# Altium footprint library DIP Component.PcbLib: 327 footprints (part 3 of 21)
Each footprint in its own frame and in the unit in brackets; x right, y up, seen from the top. Pads: shape width x height; smd on the part's side, far side on the other; paste and mask are expansions set on the pad; w line width, h text height; cw(c..) or ccw(c..) is an arc to the next point about the centre after c.
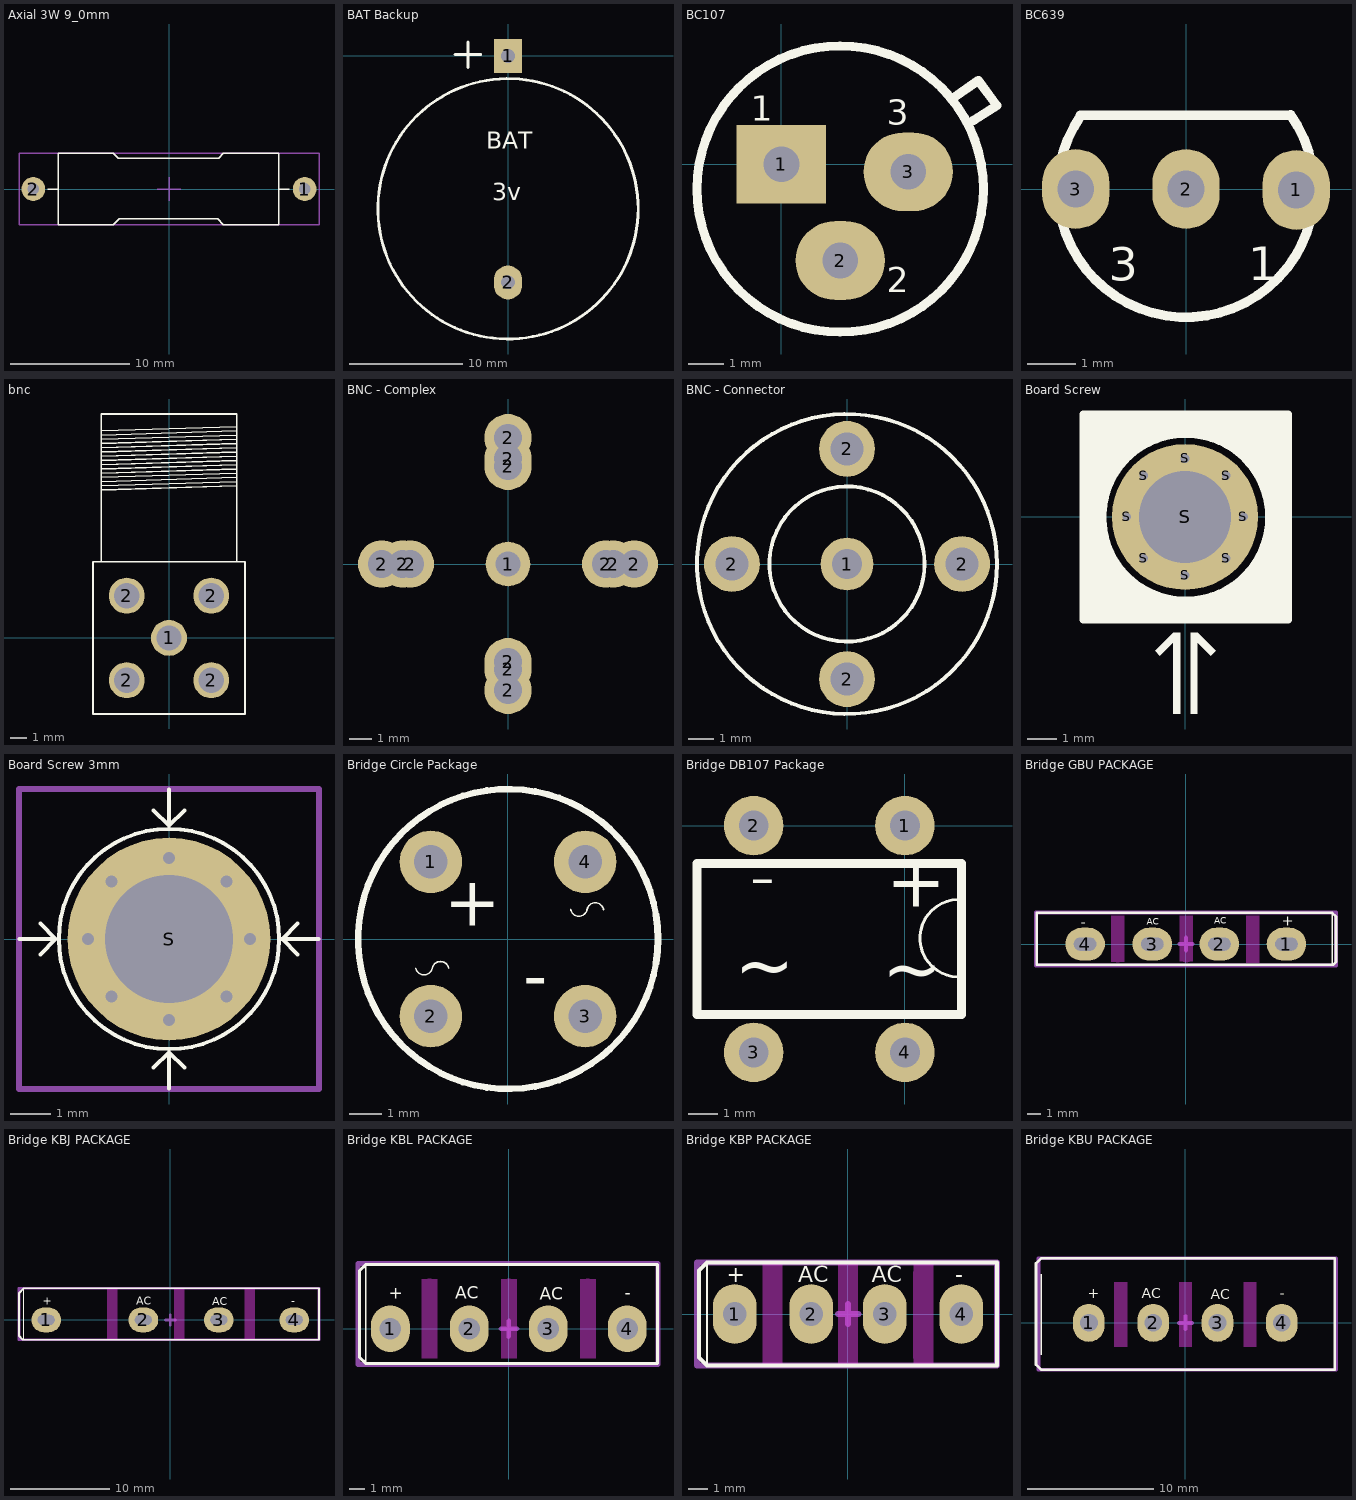
[diagram p2: the footprints below, top view; thin cyan lines are the x and y axes]

## Axial 3W 9_0mm [mm] "Designer Abbas Basereh"
height 9
pads (2):
  round 2 hole 1: 1(11.4,0) 2(-11.4,0)
Top Overlay:
  lines w0.12: -10.2,0 -9.3,0 ; 9.2,0 10.1,0 ; -9.3,-3 -4.675,-3 -4.175,-2.5 4.075,-2.5 4.575,-3 9.2,-3 9.2,3 4.575,3 4.175,2.6 -4.275,2.6 -4.675,3 -9.3,3 -9.3,-3
Mechanical 15:
  lines w0.12: -1,0 1,0 ; 0,-1 0,1 ; -12.6,-3 -12.6,3 12.6,3 12.6,-3 -12.6,-3
3D body "User Library-Res90 3W SilCoat.STEP": height 6.73, standoff -1.3, extent -11.835,-3.01 11.835,3.01

## BAT Backup [mm]
pads (2):
  rect 2.5x3 hole 1.2: 1(0,0)
  oval 2.5x3 hole 1.2: 2(0,-20)
Top Overlay:
  circle w0.254: c0,-13.5 r11.5
  lines w0.254: -4.67,0.14 -2.41,0.14 ; -3.52,-1.01 -3.52,1.25
  text "3v" at -1.405,-12.75 h1.52
  text "BAT" at -1.905,-8.18 h1.52
3D body "User Library-20mm_coin_holder.STEP": height 9.17, standoff -3, extent -11.5,-24.716 11.5,2.716

## BC107 [mm]
pads (3):
  rect 2.5x2.2 hole 1: 1(0,0)
  oval 2.5x2.2 hole 1: 2(1.64,-2.69) 3(3.54,-0.21)
Top Overlay:
  circle w0.254: c1.64,-0.69 r4
  lines w0.254: 4.78,1.85 5.5,2.34 6.02,1.64 5.37,1.23
  text "3" at 2.935,1.1 h0.7
  text "1" at -0.86,1.21 h0.7
  text "2" at 2.935,-3.57 h0.7

## BC639 [mil] "NPN Transistorq"
height 322.83
pads (3):
  oval 55x65 hole 30: 1(90,-0.79) 2(0,0) 3(-90,0)
Top Overlay:
  lines w7.87: -86.22,60.24 84.65,60.24 ; -85.85,59.98 ccw(c0,0) 85.32,60.72
  text "1" at 51,-74.41 h27.56
  text "3" at -62.99,-74.8 h27.56
3D body "SW3dPS-TO-92A.STEP": height 314.96, standoff -118.11, extent -90.55,-94.49 98.43,60.24

## bnc [mil]
pads (5):
  round 85 hole 60 mask+10: 1(0,0) 2(-100,-100) 2(-100,100) 2(100,-100) 2(100,100)
Top Overlay:
  lines w3.94: -160,180 -160,530 160,530 160,180 ; -160,490 160,500 160,490 -160,480 -160,470 160,480 160,470 -160,460 -160,450 160,460 160,450 -160,440 -160,430 160,440 160,430 -160,420 -160,410 160,420 160,410 -160,400 -160,390 160,400 160,390 -160,380 -160,370 160,380 160,370 -160,360 -160,350 160,360 ; -180,-180 -180,180 180,180 180,-180 -180,-180

## BNC - Complex [mil]
pads (13):
  round 80 hole 45: 1(0,0)
  round 85 hole 50: 2(-226.38,0) 2(-188.98,0) 2(-175.2,0) 2(0,-226.38) 2(0,-188.98) 2(0,-175.2) 2(0,175.2) 2(0,188.98) 2(0,226.38) 2(175.2,0) 2(188.98,0) 2(226.38,0)
3D body "BNC_complex.STEP": height 1369.68, standoff -173.23, extent -278,-278.21 278,278.2

## BNC - Connector [mil]
pads (5):
  round 80 hole 45: 1(0,0)
  round 85 hole 50: 2(-175.2,0) 2(0,-175.2) 2(0,175.2) 2(175.2,0)
Top Overlay:
  circle w5.91: c0,0 r118.11
  circle w5.91: c0,0 r228.35
3D body "My BNC Short.STEP": height 538.19, standoff -173.23, extent -218.11,-218.11 218.11,218.11

## Board Screw [mm]
pads (9):
  round 0.6 hole 0.3: S(-2,0) S(-1.414,-1.414) S(-1.414,1.414) S(0,-2) S(0,2) S(1.414,-1.414) S(1.414,1.414) S(2,0)
  round 5 hole 3.15 mask+0.1: S(0,0)
Top Overlay:
  circle w0.889: c0.025,-0.012 r3.165
  region: 0.433,-3.957 0.253,-4.137 0.882,-4.765 1.062,-4.586
  rectangle: 0.179,-6.751 0.433,-3.957
  region: -1.038,-4.586 -0.859,-4.765 -0.23,-4.137 -0.41,-3.957
  region: -0.156,-3.957 -0.41,-3.957 -0.41,-6.751 -0.156,-6.751
  region: -3.492,-3.528 -3.489,-3.531 -0.749,-3.531 -0.749,-3.482 -3.492,-0.739
  region: 3.559,-3.526 3.556,-3.528 0.816,-3.528 0.816,-3.479 3.559,-0.736
  region: 3.559,3.508 3.556,3.51 0.816,3.51 0.816,3.461 3.559,0.718
  region: -3.492,3.505 -3.489,3.508 -0.749,3.508 -0.749,3.458 -3.492,0.716
  lines w0.254: -3.494,-3.511 -3.494,3.522 3.539,3.522 ; -3.492,-3.528 3.542,-3.528 3.542,3.505
Bottom Overlay:
  circle w0.889: c0.025,-0.012 r3.165
  region: -3.492,3.505 -3.489,3.508 -0.749,3.508 -0.749,3.458 -3.492,0.716
  region: 3.559,3.508 3.556,3.51 0.816,3.51 0.816,3.461 3.559,0.718
  region: 3.559,-3.526 3.556,-3.528 0.816,-3.528 0.816,-3.479 3.559,-0.736
  region: -3.492,-3.528 -3.489,-3.531 -0.749,-3.531 -0.749,-3.482 -3.492,-0.739
  lines w0.254: -3.494,-3.511 -3.494,3.522 3.539,3.522 ; -3.492,-3.528 3.542,-3.528 3.542,3.505
3D body "User Library-User Library-4-40 x _125 sems.STEP": height 2.34, standoff -3, extent -2.667,-2.642 2.692,2.718

## Board Screw 3mm [mm]
pads (1):
  round 5 hole 3.15 mask+0.1: S(0,0)
via 0,2 diameter 0.5 hole 0.3
via 1.414,1.414 diameter 0.5 hole 0.3
via 2,0 diameter 0.5 hole 0.3
via 1.414,-1.414 diameter 0.5 hole 0.3
via 0,-2 diameter 0.5 hole 0.3
via -1.414,-1.414 diameter 0.5 hole 0.3
via -2,0 diameter 0.5 hole 0.3
via -1.414,1.414 diameter 0.5 hole 0.3
Top Overlay:
  circle w0.1: c0,0 r2.718
  lines w0.1: -3.683,0 -2.794,0 ; -3.175,-0.381 -2.794,0 ; -3.175,0.381 -2.794,0 ; -0.381,-3.175 0,-2.794 ; -0.381,3.175 0,2.794 ; 0,-3.683 0,-2.794 ; 0,3.683 0,2.794 ; 0.381,-3.175 0,-2.794 ; 0.381,3.175 0,2.794 ; 2.718,0 3.683,0 ; 3.175,-0.381 2.794,0 3.175,0.381
Mechanical 15:
  lines w0.15: -3.7,-3.7 -3.7,3.7 3.7,3.7 3.7,-3.7 -3.7,-3.7
3D body "User Library-User Library-4-40 x _125 sems.STEP": height 2.34, standoff -3, extent -2.667,-2.667 2.692,2.692

## Bridge Circle Package [mm] "Circle Bridge Rectifiers DESIGNER :Ali Hafizi"
height 5.1
pads (4):
  round 1.905 hole 1.016: 1(-2.35,2.35) 2(-2.35,-2.35) 3(2.35,-2.35) 4(2.35,2.35)
Top Overlay:
  circle w0.2: c0,0 r4.572
  lines w0.05: -2.81,-0.89 ccw(c-2.56,-0.84) -2.31,-0.89 cw(c-2.06,-0.94) -1.81,-0.89 ; 1.91,0.9 ccw(c2.16,0.95) 2.41,0.9 cw(c2.66,0.85) 2.91,0.9
  text "+" at -1.94,0.41 h1.5
  text "-" at 0.46,-1.85 h1.5
3D body "bridge.STEP": height 5.21, standoff -1.9, extent -4.043,-4.074 4.057,4.026

## Bridge DB107 Package [mm] "DB107 Bridge Rectifiers DESIGNER :Ali Hafizi"
pads (4):
  round 2 hole 1 mask+0.025: 1(0,0) 2(-5.08,0) 3(-5.08,-7.62) 4(0,-7.62)
Top Overlay:
  lines w0.1: 1.778,-5.08 cw(c1.797,-3.785) 1.778,-2.49
  lines w0.3: -6.985,-6.35 -6.985,-1.27 1.905,-1.27 1.905,-6.35 -6.985,-6.35
  text "-" at -5.207,-3.048 h3
  text "+" at -0.635,-3.302 h3
  text "~" at -0.762,-6.223 h3
  text "~" at -5.715,-6.096 h3
3D body "User Library-DIP-4 300mil Black.step": height 4.8, standoff -1.7, extent -6.38,-7.62 1.32,0.363

## Bridge GBU PACKAGE [mm] "GBU Bridge Rectifiers DESIGNER :ABBAS BASEREH"
height 30
pads (4):
  oval 3x2.5 hole 1 slot 1.7 at 0 deg: 1(7.62,0) 2(2.54,0) 3(-2.54,0) 4(-7.63,0)
Top Overlay:
  lines w0.1: 11.075,-1.575 11.075,2.375
  lines w0.2: -11.3,-1.575 -11.3,2.375 11.075,2.375 11.375,2.075 11.375,-1.35 11.15,-1.575 -11.3,-1.575
  text "AC" at -2.95,1.475 h0.5
  text "+" at 7.275,1.375 h0.8
  text "-" at -7.975,1.275 h0.8
  text "AC" at 2.15,1.525 h0.5
Keep-Out Layer:
  board cut-out: -5.65,2.15 -4.65,2.15 -4.65,-1.35 -5.65,-1.35
  board cut-out: -0.475,2.15 0.525,2.15 0.525,-1.3 -0.475,-1.3
  board cut-out: 4.575,2.15 5.575,2.15 5.575,-1.425 4.575,-1.425
Keep-Out Layer:
  lines w1: -5.15,-0.9 -5.15,1.65 ; 0.025,-0.875 0.025,1.65 ; 5.05,-0.925 5.05,1.65
Mechanical 15:
  lines w0.3: -0.5,0 0.525,0 ; 0,-0.5 0,0.5 ; -11.35,-1.625 11.375,-1.625 11.375,2.4 -11.35,2.4 -11.35,-1.625
3D body "User Library-GBU.STEP": height 21.83, standoff -2.5, extent -11.125,-1.41 11.175,2.15

## Bridge KBJ PACKAGE [mm] "KBJ Bridge Rectifiers DESIGNER :ABBAS BASEREH"
height 35
pads (4):
  oval 3x2.5 hole 1 slot 1.7 at 0 deg: 1(-12.525,0) 2(-2.715,0) 3(4.905,0) 4(12.525,0)
Top Overlay:
  lines w0.1: -14.775,-2 -14.775,3.1
  lines w0.2: -15.275,-1.6 -14.875,-2 15.025,-2 15.025,3.2 -14.775,3.2 -15.275,2.7 -15.275,-1.6
  text "+" at -12.875,1.525 h0.8
  text "-" at 12.225,1.525 h0.8
  text "AC" at 4.225,1.5 h0.8
  text "AC" at -3.408,1.525 h0.8
Keep-Out Layer:
  board cut-out: -6.375,3.2 -5.375,3.2 -5.375,-1.9 -6.375,-1.9
  board cut-out: 0.425,3.1 1.425,3.1 1.425,-2 0.425,-2
  board cut-out: 7.55,3.1 8.55,3.1 8.55,-2 7.55,-2
Keep-Out Layer:
  lines w1: -5.875,-1.425 -5.875,2.725 ; 0.925,-1.525 0.925,2.625 ; 8.025,-1.525 8.025,2.625
Mechanical 15:
  lines w0.3: -0.5,0 0.525,0 ; 0,-0.5 0,0.5 ; -15.275,-2 15.025,-2 15.025,3.2 -15.275,3.2 -15.275,-2
3D body "User Library-KBJ-GSIB.STEP": height 31.25, standoff -7.71, extent -15.071,-1.8 14.925,3

## Bridge KBL PACKAGE [mm] "KBL Bridge Rectifiers DESIGNER :ABBAS BASEREH"
height 15
pads (4):
  oval 2.5x3 hole 1.4: 1(-7.62,0) 2(-2.54,0) 3(2.54,0) 4(7.62,0)
Top Overlay:
  lines w0.1: -9.2,-2.225 -9.2,4.125
  lines w0.2: -9.612,-1.813 -9.612,3.713 -9.2,4.125 9.563,4.125 9.563,-2.225 -9.2,-2.225 -9.612,-1.813
  text "AC" at -3.45,1.925 h0.8
  text "AC" at 2,1.875 h0.8
  text "-" at 7.475,1.925 h0.8
  text "+" at -7.725,1.925 h0.8
Keep-Out Layer:
  board cut-out: 4.6,3.2 5.6,3.2 5.6,-1.9 4.6,-1.9
  board cut-out: -0.5,3.2 0.5,3.2 0.5,-1.9 -0.5,-1.9
  board cut-out: -5.6,3.2 -4.6,3.2 -4.6,-1.9 -5.6,-1.9
Keep-Out Layer:
  lines w1: -5.1,-1.425 -5.1,2.725 ; 0,-1.425 0,2.725 ; 5.075,-1.425 5.075,2.725
Mechanical 15:
  lines w0.3: -0.5,0 0.525,0 ; 0,-0.5 0,0.5 ; -9.7,-2.3 -9.7,4.2 9.6,4.2 9.6,-2.3 -9.7,-2.3
3D body "User Library-KBL-1.STEP": height 16.05, standoff -4.2, extent -9.512,-2.125 9.488,4.126

## Bridge KBP PACKAGE [mm] "KBP Bridge Rectifiers DESIGNER :ABBAS BASEREH"
height 10
pads (4):
  oval 2.2x3 hole 1.2: 1(-5.7,0) 2(-1.85,0) 3(1.85,0) 4(5.7,0)
Top Overlay:
  lines w0.1: -7.1,-2.55 -7.1,2.6
  lines w0.2: -7.5,-2.2 -7.5,2.2 -7.1,2.6 7.5,2.6 7.5,-2.6 -7.1,-2.6 -7.5,-2.2
  text "AC" at -2.5,1.6 h0.8
  text "AC" at 1.2,1.6 h0.8
  text "-" at 5.4,1.6 h0.8
  text "+" at -6.1,1.6 h0.8
Keep-Out Layer:
  board cut-out: 3.3,2.5 4.3,2.5 4.3,-2.6 3.3,-2.6
  board cut-out: -0.5,2.5 0.5,2.5 0.5,-2.6 -0.5,-2.6
  board cut-out: -4.3,2.5 -3.3,2.5 -3.3,-2.6 -4.3,-2.6
Keep-Out Layer:
  lines w1: -3.8,-2.125 -3.8,2.025 ; 0,-2.125 0,2.025 ; 3.775,-2.125 3.775,2.025
Mechanical 15:
  lines w0.3: -0.5,0 0.525,0 ; 0,-0.5 0,0.5 ; -7.6,-2.6 -7.6,2.6 7.5,2.6 7.5,-2.6 -7.6,-2.6
3D body "User Library-KBP.STEP": height 12.49, standoff -3.2, extent -7.377,-2.415 7.353,2.41

## Bridge KBU PACKAGE [mm] "KBU Bridge Rectifiers DESIGNER :ABBAS BASEREH"
height 18
pads (4):
  oval 2.5x3 hole 1.4: 1(-7.62,0) 2(-2.54,0) 3(2.54,0) 4(7.62,0)
Top Overlay:
  lines w0.1: -11.4,-2.5 -11.4,3.85
  lines w0.2: -11.8,-3.3 -11.8,4.7 -11.4,5.1 11.8,5.1 11.8,-3.7 -11.4,-3.7 -11.8,-3.3
  text "AC" at -3.45,1.925 h0.8
  text "AC" at 2,1.875 h0.8
  text "-" at 7.475,1.925 h0.8
  text "+" at -7.725,1.925 h0.8
Keep-Out Layer:
  board cut-out: 4.6,3.2 5.6,3.2 5.6,-1.9 4.6,-1.9
  board cut-out: -0.5,3.2 0.5,3.2 0.5,-1.9 -0.5,-1.9
  board cut-out: -5.6,3.2 -4.6,3.2 -4.6,-1.9 -5.6,-1.9
Keep-Out Layer:
  lines w1: -5.1,-1.425 -5.1,2.725 ; 0,-1.425 0,2.725 ; 5.075,-1.425 5.075,2.725
Mechanical 15:
  lines w0.3: -0.5,0 0.525,0 ; 0,-0.5 0,0.5 ; -11.6,-3.7 -11.6,5.1 11.9,5.1 11.9,-3.7 -11.6,-3.7
3D body "User Library-KBU.STEP": height 19.6, standoff -4.2, extent -11.612,-3.55 11.588,4.95